# Altium footprint library Connectors THD.PcbLib: 631 footprints (part 44 of 46) (continued)
## TYCO_6469028-1 [mm] "40 Positions, Pitch 2.5mm,  Advanced TCA, Z-PACK HM-Zd Right Angle Press Fit Receptacle"
height 8.58
pads (60):
  round 1.1 hole 0.6: A1(3,11.7) A2(3,9.2) A3(3,6.7) A4(3,4.2) A5(3,1.7) A6(3,-0.8) A7(3,-3.3) A8(3,-5.8) A9(3,-8.3) A10(3,-10.8) B1(1.5,11.7) B2(1.5,9.2) B3(1.5,6.7) B4(1.5,4.2) B5(1.5,1.7) B6(1.5,-0.8) B7(1.5,-3.3) B8(1.5,-5.8) B9(1.5,-8.3) B10(1.5,-10.8) BG1(0,11.7) BG2(0,9.2) BG3(0,6.7) BG4(0,4.2) BG5(0,1.7) BG6(0,-0.8) BG7(0,-3.3) BG8(0,-5.8) BG9(0,-8.3) BG10(0,-10.8) C1(-1.5,11.7) C2(-1.5,9.2) C3(-1.5,6.7) C4(-1.5,4.2) C5(-1.5,1.7) C6(-1.5,-0.8) C7(-1.5,-3.3) C8(-1.5,-5.8) C9(-1.5,-8.3) C10(-1.5,-10.8) D1(-3,11.7) D2(-3,9.2) D3(-3,6.7) D4(-3,4.2) D5(-3,1.7) D6(-3,-0.8) D7(-3,-3.3) D8(-3,-5.8) D9(-3,-8.3) D10(-3,-10.8) DG1(-4.5,11.7) DG2(-4.5,9.2) DG3(-4.5,6.7) DG4(-4.5,4.2) DG5(-4.5,1.7) DG6(-4.5,-0.8) DG7(-4.5,-3.3) DG8(-4.5,-5.8) DG9(-4.5,-8.3) DG10(-4.5,-10.8)
Top Overlay:
  lines w0.2: -5.2,-11.583 -5.2,-12.45 13.7,-12.45 13.7,12.45 -5.2,12.45 ; 3.54,-12.45 3.54,-11.701 ; 3.54,-11.88 7.9,-11.88 7.9,-10.62 4.034,-10.62 ; 3.54,-9.38 7.9,-9.38 7.9,-8.12 4.034,-8.12 ; 3.54,-6.88 7.9,-6.88 7.9,-5.62 4.034,-5.62 ; 3.54,-4.38 7.9,-4.38 7.9,-3.12 4.034,-3.12 ; 3.54,-1.88 7.9,-1.88 7.9,-0.62 4.034,-0.62 ; 3.54,0.62 7.9,0.62 7.9,1.88 4.034,1.88 ; 3.54,3.12 7.9,3.12 7.9,4.38 4.034,4.38 ; 3.54,5.62 7.9,5.62 7.9,6.88 3.54,6.88 ; 3.54,8.12 7.9,8.12 7.9,9.38 3.54,9.38 ; 3.54,10.62 7.9,10.62 7.9,11.88 4.034,11.88 ; 4.45,-12.45 4.45,-11.88 ; 4.45,-10.62 4.45,-9.38 ; 4.45,-8.12 4.45,-6.88 ; 4.45,-5.62 4.45,-4.38 ; 4.45,-3.12 4.45,-1.88 ; 4.45,-0.62 4.45,0.62 ; 4.45,1.88 4.45,3.12 ; 4.45,4.38 4.45,5.62 ; 4.45,6.88 4.45,8.12 ; 4.45,9.38 4.45,10.62 ; 4.45,11.88 4.45,12.45 ; 11.13,-6.963 11.13,-3.037 ; 11.13,3.037 11.13,6.963 ; 13.35,-12.45 13.35,-7 ; 13.35,-3 13.35,3 ; 13.35,7 13.35,12.45 ; 13.7,-9.5 14.7,-8.5 14.7,-6.5 14.45,-6.25 ; 13.7,9.5 14.7,8.5 14.7,6.5 14.45,6.25 ; 9.4,-6.903 9.4,-3.097 13.7,-3 14.7,-4 14.7,-6 13.7,-7 12.2,-7 9.4,-6.903 ; 9.4,3.097 9.4,6.903 13.7,7 14.7,6 14.7,4 13.7,3 12.2,3 9.4,3.097
Mechanical 8:
  drawing of 246 lines, arcs and shapes, not listed
  text "PCB Edge" at 5.865,-3.5 h1
Mechanical 14:
  lines w0.1: 3.54,-12.45 3.54,12.45 ; 3.54,-11.88 7.9,-11.88 7.9,-10.62 3.54,-10.62 ; 3.54,-9.38 7.9,-9.38 7.9,-8.12 3.54,-8.12 ; 3.54,-6.88 7.9,-6.88 7.9,-5.62 3.54,-5.62 ; 3.54,-4.38 7.9,-4.38 7.9,-3.12 3.54,-3.12 ; 3.54,-1.88 7.9,-1.88 7.9,-0.62 3.54,-0.62 ; 3.54,0.62 7.9,0.62 7.9,1.88 3.54,1.88 ; 3.54,3.12 7.9,3.12 7.9,4.38 3.54,4.38 ; 3.54,5.62 7.9,5.62 7.9,6.88 3.54,6.88 ; 3.54,8.12 7.9,8.12 7.9,9.38 3.54,9.38 ; 3.54,10.62 7.9,10.62 7.9,11.88 3.54,11.88 ; 4.45,-12.45 4.45,-11.88 ; 4.45,-10.62 4.45,-9.38 ; 4.45,-8.12 4.45,-6.88 ; 4.45,-5.62 4.45,-4.38 ; 4.45,-3.12 4.45,-1.88 ; 4.45,-0.62 4.45,0.62 ; 4.45,1.88 4.45,3.12 ; 4.45,4.38 4.45,5.62 ; 4.45,6.88 4.45,8.12 ; 4.45,9.38 4.45,10.62 ; 4.45,11.88 4.45,12.45 ; 5,-12.45 5,-11.5 ; 5,-10.5 5,-9.5 ; 5,-8.5 5,-7.5 ; 5,-6.5 5,-5.5 ; 5,-4.5 5,-3.5 ; 5,-2.5 5,-1.5 ; 5,-0.5 5,0.5 ; 5,1.5 5,2.5 ; 5,3.5 5,4.5 ; 5,5.5 5,6.5 ; 5,7.5 5,8.5 ; 5,9.5 5,10.5 ; 5,11.5 5,12.45 ; 11.13,-6.963 11.13,-3.037 ; 11.13,3.037 11.13,6.963 ; 13.35,-12.45 13.35,-7 ; 13.35,-3 13.35,3 ; 13.35,7 13.35,12.45 ; 13.7,-9.5 14.7,-8.5 14.7,-6.5 14.45,-6.25 ; 13.7,9.5 14.7,8.5 14.7,6.5 14.45,6.25 ; -5.2,-12.45 13.7,-12.45 13.7,12.45 -5.2,12.45 -5.2,-12.45 ; 9.4,-6.903 9.4,-3.097 13.7,-3 14.7,-4 14.7,-6 13.7,-7 12.2,-7 9.4,-6.903 ; 9.4,3.097 9.4,6.903 13.7,7 14.7,6 14.7,4 13.7,3 12.2,3 9.4,3.097
Drill Drawing:
  lines w0.1: -5.2,-12.45 -5.2,12.45 3.775,12.45 3.775,-12.45 -5.2,-12.45
  text "PRESS-FIT TECHNOLOGY" at 5.265,-8.3 h1
  text "diam. 0.6mm +0.06 -0" at 6.765,-9.3 h1
3D body: height 8.67, standoff -4.68, extent -5.2,-12.45 14.7,12.45

## VERO_20-2136 [mm] "Black Bead PCB Terminal Test Pin (1.32 mm hole)"
height 5.4
pads (1):
  round 2 hole 1.3: 1(0,0)
Top Overlay:
  circle w0.2: c0,0 r1.5
Mechanical 14:
  circle w0.1: c0,0 r1.5
3D body: height 5.4, standoff -3.17, extent -1.5,-1.5 1.5,1.5

## WAGO_236-402 [mm] "16A 250VAC 2 Way PCB Terminal Block, Pitch 5mm, CAGE CLAMP® Connection, Wire Size Max: 2.5mm²"
height 13
pads (4):
  round 1.8 hole 1.1: 1(-2.5,-2.5) 1(-2.5,2.5) 2(2.5,-2.5) 2(2.5,2.5)
Top Overlay:
  lines w0.2: -5.4,-5.34 -6,-5.34 -6,-4.14 -5.4,-4.14 ; -5.4,-1.51 -6,-1.51 -6,0.09 -5.4,0.09 ; -5.4,0.77 5.6,0.77 ; -5.4,1.256 5.6,1.256 0.6,1.256 1.1,1.256 ; -5.4,2.76 -3.723,2.76 ; -5.4,3.582 -6,3.582 -6,5.182 -5.4,5.182 ; -5.4,5.905 -6,5.905 -6,7.101 -5.4,7.101 ; -4.4,-2.937 -3.962,-2.937 ; -3.7,-0.745 -0.1,-0.745 ; -3.7,0.21 -0.1,0.21 ; -3.671,-2.937 -3.962,-2.937 ; -3.5,-3.25 -3.5,-4.245 ; -2.715,3.957 -2.715,6.149 ccw(c-3.215,6.192) -3.008,6.649 ccw(c-3.952,4.735) -3.715,6.857 ; -2.715,5.796 -1.485,5.796 ; -1.485,3.957 -1.485,6.149 cw(c-0.985,6.192) -1.192,6.649 cw(c-0.247,4.735) -0.485,6.857 ; -1.329,-2.937 1.329,-2.937 ; -1.277,2.76 1.277,2.76 ; -1.05,-2.937 -1.05,-4.245 ; 0.106,-2.937 0.2,-3.043 ; 1.038,-2.937 1,-3.043 ; 1.3,-0.745 4.9,-0.745 ; 1.3,0.21 4.9,0.21 ; 1.5,-3.25 1.5,-4.245 ; 2.285,3.957 2.285,6.149 ccw(c1.785,6.192) 1.992,6.649 ccw(c1.048,4.735) 1.285,6.857 ; 2.285,5.796 3.515,5.796 ; 3.515,3.957 3.515,6.149 cw(c4.015,6.192) 3.808,6.649 cw(c4.753,4.735) 4.515,6.857 ; 3.671,-2.937 5.6,-2.937 ; 3.723,2.76 5.6,2.76 ; 3.95,-2.937 3.95,-4.245 ; 5.106,-2.937 5.2,-3.043 ; 5.6,-6.585 -5.4,-6.585 -5.4,7.5 5.6,7.5 5.6,-6.572 ; 5.6,-3.043 5.2,-3.043 ; 5.6,-1.968 6.3,-1.968 6.3,1.412 5.6,1.412 ; 5.6,-0.851 4.9,-0.851 4.9,0.705 1.3,0.705 1.3,-0.851 -0.1,-0.851 -0.1,0.705 -3.7,0.705 -3.7,-0.851 -4.4,-0.851 -4.4,-3.043 -4,-3.043 ; -4,-6.231 -3.5,-4.245 ; -4,-6.231 0.2,-6.231 ; -4,-6.231 -4,-3.043 ; -4,-3.043 -3.962,-2.937 ; -3.715,6.857 -3.715,3.957 -0.485,3.957 -0.485,6.857 ; -3.715,6.857 -0.485,6.857 ; -3.5,-4.245 -1.05,-4.245 ; -1.05,-4.245 0.2,-6.231 ; 0.2,-6.231 0.2,-3.043 ; 0.2,-3.043 1,-3.043 ; 1,-6.231 1.5,-4.245 ; 1,-6.231 5.2,-6.231 ; 1,-6.231 1,-3.043 ; 1.285,6.857 1.285,3.957 4.515,3.957 4.515,6.857 ; 1.285,6.857 4.515,6.857 ; 1.5,-4.245 3.95,-4.245 ; 3.95,-4.245 5.2,-6.231 ; 5.2,-6.231 5.2,-3.043
Mechanical 8:
  lines w0.1: -3.5,-2.5 -2.5,-2.5 ; -3.5,2.5 -2.5,2.5 ; -2.5,-3.5 -2.5,-2.5 ; -2.5,-1.5 -2.5,-2.5 ; -2.5,1.5 -2.5,2.5 ; -2.5,3.5 -2.5,2.5 ; -1.5,-2.5 -2.5,-2.5 ; -1.5,2.5 -2.5,2.5 ; -0.5,0 0,0 ; 0,-0.5 0,0 ; 0,0.5 0,0 ; 0.5,0 0,0 ; 1.5,-2.5 2.5,-2.5 ; 1.5,2.5 2.5,2.5 ; 2.5,-3.5 2.5,-2.5 ; 2.5,-1.5 2.5,-2.5 ; 2.5,1.5 2.5,2.5 ; 2.5,3.5 2.5,2.5 ; 3.5,-2.5 2.5,-2.5 ; 3.5,2.5 2.5,2.5
Mechanical 14:
  lines w0.1: -5.4,-5.34 -6,-5.34 -6,-4.14 -5.4,-4.14 ; -5.4,-1.51 -6,-1.51 -6,0.09 -5.4,0.09 ; -5.4,0.77 5.6,0.77 ; -5.4,1.256 5.6,1.256 0.6,1.256 ; -5.4,2.76 5.6,2.76 ; -5.4,3.582 -6,3.582 -6,5.182 -5.4,5.182 ; -5.4,5.905 -6,5.905 -6,7.101 -5.4,7.101 ; -4.4,-2.937 5.6,-2.937 ; -3.962,-2.937 -4,-3.043 ; -3.7,-0.745 -0.1,-0.745 ; -3.7,0.21 -0.1,0.21 ; -3.5,-2.937 -3.5,-4.245 ; -2.715,3.957 -2.715,6.149 ccw(c-3.215,6.192) -3.008,6.649 ccw(c-3.952,4.735) -3.715,6.857 ; -2.715,5.796 -1.485,5.796 ; -1.485,3.957 -1.485,6.149 cw(c-0.985,6.192) -1.192,6.649 cw(c-0.247,4.735) -0.485,6.857 ; -1.05,-2.937 -1.05,-4.245 ; 0.106,-2.937 0.2,-3.043 ; 1.038,-2.937 1,-3.043 ; 1.3,-0.745 4.9,-0.745 ; 1.3,0.21 4.9,0.21 ; 1.5,-2.937 1.5,-4.245 ; 2.285,3.957 2.285,6.149 ccw(c1.785,6.192) 1.992,6.649 ccw(c1.048,4.735) 1.285,6.857 ; 2.285,5.796 3.515,5.796 ; 3.515,3.957 3.515,6.149 cw(c4.015,6.192) 3.808,6.649 cw(c4.753,4.735) 4.515,6.857 ; 3.95,-2.937 3.95,-4.245 ; 5.106,-2.937 5.2,-3.043 ; 5.6,-6.585 -5.4,-6.585 -5.4,7.5 5.6,7.5 5.6,-6.572 ; 5.6,-3.043 5.2,-3.043 ; 5.6,-1.968 6.3,-1.968 6.3,1.412 5.6,1.412 ; 5.6,-0.851 4.9,-0.851 4.9,0.705 1.3,0.705 1.3,-0.851 -0.1,-0.851 -0.1,0.705 -3.7,0.705 -3.7,-0.851 -4.4,-0.851 -4.4,-3.043 -4,-3.043 ; -4,-6.231 -3.5,-4.245 ; -4,-6.231 0.2,-6.231 ; -4,-6.231 -4,-3.043 ; -3.715,6.857 -3.715,3.957 -0.485,3.957 -0.485,6.857 ; -3.715,6.857 -0.485,6.857 ; -3.5,-4.245 -1.05,-4.245 ; -1.05,-4.245 0.2,-6.231 ; 0.2,-6.231 0.2,-3.043 ; 0.2,-3.043 1,-3.043 ; 1,-6.231 1.5,-4.245 ; 1,-6.231 5.2,-6.231 ; 1,-6.231 1,-3.043 ; 1.285,6.857 1.285,3.957 4.515,3.957 4.515,6.857 ; 1.285,6.857 4.515,6.857 ; 1.5,-4.245 3.95,-4.245 ; 3.95,-4.245 5.2,-6.231 ; 5.2,-6.231 5.2,-3.043
3D body: height 12.71, standoff -4, extent -6,-6.585 6.3,7.5

## WAGO_236-403 [mm] "16A 250VAC 3 Way PCB Terminal Block, Pitch 5mm, CAGE CLAMP® Connection, Wire Size Max: 2.5mm²"
height 13
pads (6):
  round 1.8 hole 1.1: 1(-5,-2.5) 1(-5,2.5) 2(0,-2.5) 2(0,2.5) 3(5,-2.5) 3(5,2.5)
Top Overlay:
  lines w0.2: -7.9,-5.34 -8.5,-5.34 -8.5,-4.14 -7.9,-4.14 ; -7.9,-1.51 -8.5,-1.51 -8.5,0.09 -7.9,0.09 ; -7.9,0.77 8.1,0.77 ; -7.9,1.256 8.1,1.256 -1.9,1.256 -1.4,1.256 ; -7.9,2.76 -6.223,2.76 ; -7.9,3.582 -8.5,3.582 -8.5,5.182 -7.9,5.182 ; -7.9,5.905 -8.5,5.905 -8.5,7.101 -7.9,7.101 ; -6.9,-2.937 -6.463,-2.937 ; -6.2,-0.745 -2.6,-0.745 ; -6.2,0.21 -2.6,0.21 ; -6.171,-2.937 -6.463,-2.937 ; -6,-3.25 -6,-4.245 ; -5.215,3.957 -5.215,6.149 ccw(c-5.715,6.192) -5.508,6.649 ccw(c-6.452,4.735) -6.215,6.857 ; -5.215,5.796 -3.985,5.796 ; -3.985,3.957 -3.985,6.149 cw(c-3.485,6.192) -3.692,6.649 cw(c-2.748,4.735) -2.985,6.857 ; -3.829,-2.937 -1.171,-2.937 ; -3.777,2.76 -1.223,2.76 ; -3.55,-2.937 -3.55,-4.245 ; -2.394,-2.937 -2.3,-3.043 ; -1.463,-2.937 -1.5,-3.043 ; -1.2,-0.745 2.4,-0.745 ; -1.2,0.21 2.4,0.21 ; -1,-3.25 -1,-4.245 ; -0.215,3.957 -0.215,6.149 ccw(c-0.715,6.192) -0.508,6.649 ccw(c-1.452,4.735) -1.215,6.857 ; -0.215,5.796 1.015,5.796 ; 1.015,3.957 1.015,6.149 cw(c1.515,6.192) 1.308,6.649 cw(c2.252,4.735) 2.015,6.857 ; 1.171,-2.937 3.829,-2.937 ; 1.223,2.76 3.777,2.76 ; 1.45,-2.937 1.45,-4.245 ; 2.606,-2.937 2.7,-3.043 ; 3.538,-2.937 3.5,-3.043 ; 3.8,-0.745 7.4,-0.745 ; 3.8,0.21 7.4,0.21 ; 4,-3.25 4,-4.245 ; 4.785,3.957 4.785,6.149 ccw(c4.285,6.192) 4.492,6.649 ccw(c3.548,4.735) 3.785,6.857 ; 4.785,5.796 6.015,5.796 ; 6.015,3.957 6.015,6.149 cw(c6.515,6.192) 6.308,6.649 cw(c7.252,4.735) 7.015,6.857 ; 6.171,-2.937 8.1,-2.937 ; 6.223,2.76 8.1,2.76 ; 6.45,-2.937 6.45,-4.245 ; 7.606,-2.937 7.7,-3.043 ; 8.1,-6.585 -7.9,-6.585 -7.9,7.5 8.1,7.5 8.1,-6.572 ; 8.1,-3.043 7.7,-3.043 ; 8.1,-1.968 8.8,-1.968 8.8,1.412 8.1,1.412 ; 8.1,-0.851 7.4,-0.851 7.4,0.705 3.8,0.705 3.8,-0.851 2.4,-0.851 2.4,0.705 -1.2,0.705 -1.2,-0.851 -2.6,-0.851 -2.6,0.705 -6.2,0.705 -6.2,-0.851 -6.9,-0.851 -6.9,-3.043 -6.5,-3.043 ; -6.5,-6.231 -6,-4.245 ; -6.5,-6.231 -2.3,-6.231 ; -6.5,-6.231 -6.5,-3.043 ; -6.5,-3.043 -6.463,-2.937 ; -6.215,6.857 -6.215,3.957 -2.985,3.957 -2.985,6.857 ; -6.215,6.857 -2.985,6.857 ; -6,-4.245 -3.55,-4.245 ; -3.55,-4.245 -2.3,-6.231 ; -2.3,-6.231 -2.3,-3.043 ; -2.3,-3.043 -1.5,-3.043 ; -1.5,-6.231 -1,-4.245 ; -1.5,-6.231 2.7,-6.231 ; -1.5,-6.231 -1.5,-3.043 ; -1.215,6.857 -1.215,3.957 2.015,3.957 2.015,6.857 ; -1.215,6.857 2.015,6.857 ; -1,-4.245 1.45,-4.245 ; 1.45,-4.245 2.7,-6.231 ; 2.7,-6.231 2.7,-3.043 ; 2.7,-3.043 3.5,-3.043 ; 3.5,-6.231 4,-4.245 ; 3.5,-6.231 7.7,-6.231 ; 3.5,-6.231 3.5,-3.043 ; 3.785,6.857 3.785,3.957 7.015,3.957 7.015,6.857 ; 3.785,6.857 7.015,6.857 ; 4,-4.245 6.45,-4.245 ; 6.45,-4.245 7.7,-6.231 ; 7.7,-6.231 7.7,-3.043
Mechanical 8:
  lines w0.1: -6,-2.5 -5,-2.5 ; -6,2.5 -5,2.5 ; -5,-3.5 -5,-2.5 ; -5,-1.5 -5,-2.5 ; -5,1.5 -5,2.5 ; -5,3.5 -5,2.5 ; -4,-2.5 -5,-2.5 ; -4,2.5 -5,2.5 ; -1,-2.5 0,-2.5 ; -1,0 0,0 ; -1,2.5 0,2.5 ; 0,-3.5 0,-2.5 ; 0,-1.5 0,-2.5 ; 0,-1 0,0 ; 0,1 0,0 ; 0,1.5 0,2.5 ; 0,3.5 0,2.5 ; 1,-2.5 0,-2.5 ; 1,0 0,0 ; 1,2.5 0,2.5 ; 4,-2.5 5,-2.5 ; 4,2.5 5,2.5 ; 5,-3.5 5,-2.5 ; 5,-1.5 5,-2.5 ; 5,1.5 5,2.5 ; 5,3.5 5,2.5 ; 6,-2.5 5,-2.5 ; 6,2.5 5,2.5
Mechanical 14:
  lines w0.1: -7.9,-5.34 -8.5,-5.34 -8.5,-4.14 -7.9,-4.14 ; -7.9,-1.51 -8.5,-1.51 -8.5,0.09 -7.9,0.09 ; -7.9,0.77 8.1,0.77 ; -7.9,1.256 8.1,1.256 -1.9,1.256 ; -7.9,2.76 8.1,2.76 ; -7.9,3.582 -8.5,3.582 -8.5,5.182 -7.9,5.182 ; -7.9,5.905 -8.5,5.905 -8.5,7.101 -7.9,7.101 ; -6.9,-2.937 8.1,-2.937 ; -6.463,-2.937 -6.5,-3.043 ; -6.2,-0.745 -2.6,-0.745 ; -6.2,0.21 -2.6,0.21 ; -6,-2.937 -6,-4.245 ; -5.215,3.957 -5.215,6.149 ccw(c-5.715,6.192) -5.508,6.649 ccw(c-6.452,4.735) -6.215,6.857 ; -5.215,5.796 -3.985,5.796 ; -3.985,3.957 -3.985,6.149 cw(c-3.485,6.192) -3.692,6.649 cw(c-2.748,4.735) -2.985,6.857 ; -3.55,-2.937 -3.55,-4.245 ; -2.394,-2.937 -2.3,-3.043 ; -1.463,-2.937 -1.5,-3.043 ; -1.2,-0.745 2.4,-0.745 ; -1.2,0.21 2.4,0.21 ; -1,-2.937 -1,-4.245 ; -0.215,3.957 -0.215,6.149 ccw(c-0.715,6.192) -0.508,6.649 ccw(c-1.452,4.735) -1.215,6.857 ; -0.215,5.796 1.015,5.796 ; 1.015,3.957 1.015,6.149 cw(c1.515,6.192) 1.308,6.649 cw(c2.252,4.735) 2.015,6.857 ; 1.45,-2.937 1.45,-4.245 ; 2.606,-2.937 2.7,-3.043 ; 3.538,-2.937 3.5,-3.043 ; 3.8,-0.745 7.4,-0.745 ; 3.8,0.21 7.4,0.21 ; 4,-2.937 4,-4.245 ; 4.785,3.957 4.785,6.149 ccw(c4.285,6.192) 4.492,6.649 ccw(c3.548,4.735) 3.785,6.857 ; 4.785,5.796 6.015,5.796 ; 6.015,3.957 6.015,6.149 cw(c6.515,6.192) 6.308,6.649 cw(c7.252,4.735) 7.015,6.857 ; 6.45,-2.937 6.45,-4.245 ; 7.606,-2.937 7.7,-3.043 ; 8.1,-6.585 -7.9,-6.585 -7.9,7.5 8.1,7.5 8.1,-6.572 ; 8.1,-3.043 7.7,-3.043 ; 8.1,-1.968 8.8,-1.968 8.8,1.412 8.1,1.412 ; 8.1,-0.851 7.4,-0.851 7.4,0.705 3.8,0.705 3.8,-0.851 2.4,-0.851 2.4,0.705 -1.2,0.705 -1.2,-0.851 -2.6,-0.851 -2.6,0.705 -6.2,0.705 -6.2,-0.851 -6.9,-0.851 -6.9,-3.043 -6.5,-3.043 ; -6.5,-6.231 -6,-4.245 ; -6.5,-6.231 -2.3,-6.231 ; -6.5,-6.231 -6.5,-3.043 ; -6.215,6.857 -6.215,3.957 -2.985,3.957 -2.985,6.857 ; -6.215,6.857 -2.985,6.857 ; -6,-4.245 -3.55,-4.245 ; -3.55,-4.245 -2.3,-6.231 ; -2.3,-6.231 -2.3,-3.043 ; -2.3,-3.043 -1.5,-3.043 ; -1.5,-6.231 -1,-4.245 ; -1.5,-6.231 2.7,-6.231 ; -1.5,-6.231 -1.5,-3.043 ; -1.215,6.857 -1.215,3.957 2.015,3.957 2.015,6.857 ; -1.215,6.857 2.015,6.857 ; -1,-4.245 1.45,-4.245 ; 1.45,-4.245 2.7,-6.231 ; 2.7,-6.231 2.7,-3.043 ; 2.7,-3.043 3.5,-3.043 ; 3.5,-6.231 4,-4.245 ; 3.5,-6.231 7.7,-6.231 ; 3.5,-6.231 3.5,-3.043 ; 3.785,6.857 3.785,3.957 7.015,3.957 7.015,6.857 ; 3.785,6.857 7.015,6.857 ; 4,-4.245 6.45,-4.245 ; 6.45,-4.245 7.7,-6.231 ; 7.7,-6.231 7.7,-3.043
3D body: height 12.71, standoff -4, extent -8.5,-6.585 8.8,7.5

## WAGO_236-403/000-009 [mm] "16A 250VAC 3 Way PCB Terminal Block, Pitch 5mm, CAGE CLAMP® Connection, Wire Size Max: 2.5mm²"
height 13
pads (6):
  round 1.8 hole 1.1: 1(-5,-2.5) 1(-5,2.5) 2(0,-2.5) 2(0,2.5) 3(5,-2.5) 3(5,2.5)
Top Overlay:
  lines w0.2: -7.9,-5.34 -8.5,-5.34 -8.5,-4.14 -7.9,-4.14 ; -7.9,-1.51 -8.5,-1.51 -8.5,0.09 -7.9,0.09 ; -7.9,0.77 8.1,0.77 ; -7.9,1.256 8.1,1.256 -1.9,1.256 -1.4,1.256 ; -7.9,2.76 -6.223,2.76 ; -7.9,3.582 -8.5,3.582 -8.5,5.182 -7.9,5.182 ; -7.9,5.905 -8.5,5.905 -8.5,7.101 -7.9,7.101 ; -6.9,-2.937 -6.463,-2.937 ; -6.2,-0.745 -2.6,-0.745 ; -6.2,0.21 -2.6,0.21 ; -6.171,-2.937 -6.463,-2.937 ; -6,-3.25 -6,-4.245 ; -5.215,3.957 -5.215,6.149 ccw(c-5.715,6.192) -5.508,6.649 ccw(c-6.452,4.735) -6.215,6.857 ; -5.215,5.796 -3.985,5.796 ; -3.985,3.957 -3.985,6.149 cw(c-3.485,6.192) -3.692,6.649 cw(c-2.748,4.735) -2.985,6.857 ; -3.829,-2.937 -1.171,-2.937 ; -3.777,2.76 -1.223,2.76 ; -3.55,-2.937 -3.55,-4.245 ; -2.394,-2.937 -2.3,-3.043 ; -1.463,-2.937 -1.5,-3.043 ; -1.2,-0.745 2.4,-0.745 ; -1.2,0.21 2.4,0.21 ; -1,-3.25 -1,-4.245 ; -0.215,3.957 -0.215,6.149 ccw(c-0.715,6.192) -0.508,6.649 ccw(c-1.452,4.735) -1.215,6.857 ; -0.215,5.796 1.015,5.796 ; 1.015,3.957 1.015,6.149 cw(c1.515,6.192) 1.308,6.649 cw(c2.252,4.735) 2.015,6.857 ; 1.171,-2.937 3.829,-2.937 ; 1.223,2.76 3.777,2.76 ; 1.45,-2.937 1.45,-4.245 ; 2.606,-2.937 2.7,-3.043 ; 3.538,-2.937 3.5,-3.043 ; 3.8,-0.745 7.4,-0.745 ; 3.8,0.21 7.4,0.21 ; 4,-3.25 4,-4.245 ; 4.785,3.957 4.785,6.149 ccw(c4.285,6.192) 4.492,6.649 ccw(c3.548,4.735) 3.785,6.857 ; 4.785,5.796 6.015,5.796 ; 6.015,3.957 6.015,6.149 cw(c6.515,6.192) 6.308,6.649 cw(c7.252,4.735) 7.015,6.857 ; 6.171,-2.937 8.1,-2.937 ; 6.223,2.76 8.1,2.76 ; 6.45,-2.937 6.45,-4.245 ; 7.606,-2.937 7.7,-3.043 ; 8.1,-6.585 -7.9,-6.585 -7.9,7.5 8.1,7.5 8.1,-6.572 ; 8.1,-3.043 7.7,-3.043 ; 8.1,-1.968 8.8,-1.968 8.8,1.412 8.1,1.412 ; 8.1,-0.851 7.4,-0.851 7.4,0.705 3.8,0.705 3.8,-0.851 2.4,-0.851 2.4,0.705 -1.2,0.705 -1.2,-0.851 -2.6,-0.851 -2.6,0.705 -6.2,0.705 -6.2,-0.851 -6.9,-0.851 -6.9,-3.043 -6.5,-3.043 ; -6.5,-6.231 -6,-4.245 ; -6.5,-6.231 -2.3,-6.231 ; -6.5,-6.231 -6.5,-3.043 ; -6.5,-3.043 -6.463,-2.937 ; -6.215,6.857 -6.215,3.957 -2.985,3.957 -2.985,6.857 ; -6.215,6.857 -2.985,6.857 ; -6,-4.245 -3.55,-4.245 ; -3.55,-4.245 -2.3,-6.231 ; -2.3,-6.231 -2.3,-3.043 ; -2.3,-3.043 -1.5,-3.043 ; -1.5,-6.231 -1,-4.245 ; -1.5,-6.231 2.7,-6.231 ; -1.5,-6.231 -1.5,-3.043 ; -1.215,6.857 -1.215,3.957 2.015,3.957 2.015,6.857 ; -1.215,6.857 2.015,6.857 ; -1,-4.245 1.45,-4.245 ; 1.45,-4.245 2.7,-6.231 ; 2.7,-6.231 2.7,-3.043 ; 2.7,-3.043 3.5,-3.043 ; 3.5,-6.231 4,-4.245 ; 3.5,-6.231 7.7,-6.231 ; 3.5,-6.231 3.5,-3.043 ; 3.785,6.857 3.785,3.957 7.015,3.957 7.015,6.857 ; 3.785,6.857 7.015,6.857 ; 4,-4.245 6.45,-4.245 ; 6.45,-4.245 7.7,-6.231 ; 7.7,-6.231 7.7,-3.043
Mechanical 8:
  lines w0.1: -6,-2.5 -5,-2.5 ; -6,2.5 -5,2.5 ; -5,-3.5 -5,-2.5 ; -5,-1.5 -5,-2.5 ; -5,1.5 -5,2.5 ; -5,3.5 -5,2.5 ; -4,-2.5 -5,-2.5 ; -4,2.5 -5,2.5 ; -1,-2.5 0,-2.5 ; -1,0 0,0 ; -1,2.5 0,2.5 ; 0,-3.5 0,-2.5 ; 0,-1.5 0,-2.5 ; 0,-1 0,0 ; 0,1 0,0 ; 0,1.5 0,2.5 ; 0,3.5 0,2.5 ; 1,-2.5 0,-2.5 ; 1,0 0,0 ; 1,2.5 0,2.5 ; 4,-2.5 5,-2.5 ; 4,2.5 5,2.5 ; 5,-3.5 5,-2.5 ; 5,-1.5 5,-2.5 ; 5,1.5 5,2.5 ; 5,3.5 5,2.5 ; 6,-2.5 5,-2.5 ; 6,2.5 5,2.5
Mechanical 14:
  lines w0.1: -7.9,-5.34 -8.5,-5.34 -8.5,-4.14 -7.9,-4.14 ; -7.9,-1.51 -8.5,-1.51 -8.5,0.09 -7.9,0.09 ; -7.9,0.77 8.1,0.77 ; -7.9,1.256 8.1,1.256 -1.9,1.256 ; -7.9,2.76 8.1,2.76 ; -7.9,3.582 -8.5,3.582 -8.5,5.182 -7.9,5.182 ; -7.9,5.905 -8.5,5.905 -8.5,7.101 -7.9,7.101 ; -6.9,-2.937 8.1,-2.937 ; -6.463,-2.937 -6.5,-3.043 ; -6.2,-0.745 -2.6,-0.745 ; -6.2,0.21 -2.6,0.21 ; -6,-2.937 -6,-4.245 ; -5.215,3.957 -5.215,6.149 ccw(c-5.715,6.192) -5.508,6.649 ccw(c-6.452,4.735) -6.215,6.857 ; -5.215,5.796 -3.985,5.796 ; -3.985,3.957 -3.985,6.149 cw(c-3.485,6.192) -3.692,6.649 cw(c-2.748,4.735) -2.985,6.857 ; -3.55,-2.937 -3.55,-4.245 ; -2.394,-2.937 -2.3,-3.043 ; -1.463,-2.937 -1.5,-3.043 ; -1.2,-0.745 2.4,-0.745 ; -1.2,0.21 2.4,0.21 ; -1,-2.937 -1,-4.245 ; -0.215,3.957 -0.215,6.149 ccw(c-0.715,6.192) -0.508,6.649 ccw(c-1.452,4.735) -1.215,6.857 ; -0.215,5.796 1.015,5.796 ; 1.015,3.957 1.015,6.149 cw(c1.515,6.192) 1.308,6.649 cw(c2.252,4.735) 2.015,6.857 ; 1.45,-2.937 1.45,-4.245 ; 2.606,-2.937 2.7,-3.043 ; 3.538,-2.937 3.5,-3.043 ; 3.8,-0.745 7.4,-0.745 ; 3.8,0.21 7.4,0.21 ; 4,-2.937 4,-4.245 ; 4.785,3.957 4.785,6.149 ccw(c4.285,6.192) 4.492,6.649 ccw(c3.548,4.735) 3.785,6.857 ; 4.785,5.796 6.015,5.796 ; 6.015,3.957 6.015,6.149 cw(c6.515,6.192) 6.308,6.649 cw(c7.252,4.735) 7.015,6.857 ; 6.45,-2.937 6.45,-4.245 ; 7.606,-2.937 7.7,-3.043 ; 8.1,-6.585 -7.9,-6.585 -7.9,7.5 8.1,7.5 8.1,-6.572 ; 8.1,-3.043 7.7,-3.043 ; 8.1,-1.968 8.8,-1.968 8.8,1.412 8.1,1.412 ; 8.1,-0.851 7.4,-0.851 7.4,0.705 3.8,0.705 3.8,-0.851 2.4,-0.851 2.4,0.705 -1.2,0.705 -1.2,-0.851 -2.6,-0.851 -2.6,0.705 -6.2,0.705 -6.2,-0.851 -6.9,-0.851 -6.9,-3.043 -6.5,-3.043 ; -6.5,-6.231 -6,-4.245 ; -6.5,-6.231 -2.3,-6.231 ; -6.5,-6.231 -6.5,-3.043 ; -6.215,6.857 -6.215,3.957 -2.985,3.957 -2.985,6.857 ; -6.215,6.857 -2.985,6.857 ; -6,-4.245 -3.55,-4.245 ; -3.55,-4.245 -2.3,-6.231 ; -2.3,-6.231 -2.3,-3.043 ; -2.3,-3.043 -1.5,-3.043 ; -1.5,-6.231 -1,-4.245 ; -1.5,-6.231 2.7,-6.231 ; -1.5,-6.231 -1.5,-3.043 ; -1.215,6.857 -1.215,3.957 2.015,3.957 2.015,6.857 ; -1.215,6.857 2.015,6.857 ; -1,-4.245 1.45,-4.245 ; 1.45,-4.245 2.7,-6.231 ; 2.7,-6.231 2.7,-3.043 ; 2.7,-3.043 3.5,-3.043 ; 3.5,-6.231 4,-4.245 ; 3.5,-6.231 7.7,-6.231 ; 3.5,-6.231 3.5,-3.043 ; 3.785,6.857 3.785,3.957 7.015,3.957 7.015,6.857 ; 3.785,6.857 7.015,6.857 ; 4,-4.245 6.45,-4.245 ; 6.45,-4.245 7.7,-6.231 ; 7.7,-6.231 7.7,-3.043
3D body: height 12.71, standoff -4, extent -8.5,-6.585 8.8,7.5

## WAGO_236-404 [mm] "16A 250VAC 4 Way PCB Terminal Block, Pitch 5mm, CAGE CLAMP® Connection, Wire Size Max: 2.5mm²"
height 13
pads (8):
  round 1.8 hole 1.1: 1(-7.6,-3.756) 1(-7.6,1.244) 2(-2.6,-3.756) 2(-2.6,1.244) 3(2.4,-3.756) 3(2.4,1.244) 4(7.4,-3.756) 4(7.4,1.244)
Top Overlay:
  lines w0.2: -10.5,-6.596 -11.1,-6.596 -11.1,-5.396 -10.5,-5.396 ; -10.5,-2.766 -11.1,-2.766 -11.1,-1.166 -10.5,-1.166 ; -10.5,-0.486 10.5,-0.486 ; -10.5,1.504 -8.823,1.504 ; -10.5,2.325 -11.1,2.325 -11.1,3.925 -10.5,3.925 ; -10.5,4.649 -11.1,4.649 -11.1,5.844 -10.5,5.844 ; -9.5,-4.193 -9.063,-4.193 ; -8.8,-2.001 -5.2,-2.001 ; -8.8,-1.047 -5.2,-1.047 ; -8.771,-4.193 -9.063,-4.193 ; -8.6,-4.506 -8.6,-5.501 ; -7.815,2.701 -7.815,4.893 ccw(c-8.315,4.936) -8.108,5.393 ccw(c-9.052,3.479) -8.815,5.6 ; -7.815,4.54 -6.585,4.54 ; -6.585,2.701 -6.585,4.893 cw(c-6.085,4.936) -6.292,5.393 cw(c-5.348,3.479) -5.585,5.6 ; -6.429,-4.193 -3.771,-4.193 ; -6.377,1.504 -3.823,1.504 ; -6.15,-4.193 -6.15,-5.501 ; -3.8,-2.001 -0.2,-2.001 ; -3.8,-1.047 -0.2,-1.047 ; -3.6,-4.506 -3.6,-5.501 ; -2.815,2.701 -2.815,4.893 ccw(c-3.315,4.936) -3.108,5.393 ccw(c-4.052,3.479) -3.815,5.6 ; -2.815,4.54 -1.585,4.54 ; -1.585,2.701 -1.585,4.893 cw(c-1.085,4.936) -1.292,5.393 cw(c-0.348,3.479) -0.585,5.6 ; -1.429,-4.193 1.229,-4.193 ; -1.377,1.504 1.177,1.504 ; -1.15,-4.193 -1.15,-5.501 ; -1,0 1,0 ; 0.006,-4.193 0.1,-4.299 ; 0.938,-4.193 0.9,-4.299 ; 1.2,-2.001 4.8,-2.001 ; 1.2,-1.047 4.8,-1.047 ; 1.4,-4.506 1.4,-5.501 ; 2.185,2.701 2.185,4.893 ccw(c1.685,4.936) 1.892,5.393 ccw(c0.948,3.479) 1.185,5.6 ; 2.185,4.54 3.415,4.54 ; 3.415,2.701 3.415,4.893 cw(c3.915,4.936) 3.708,5.393 cw(c4.652,3.479) 4.415,5.6 ; 3.571,-4.193 6.229,-4.193 ; 3.623,1.504 6.177,1.504 ; 3.85,-4.193 3.85,-5.501 ; 5.006,-4.193 5.1,-4.299 ; 5.938,-4.193 5.9,-4.299 ; 6.2,-2.001 9.8,-2.001 ; 6.2,-1.047 9.8,-1.047 ; 6.4,-4.506 6.4,-5.501 ; 7.185,2.701 7.185,4.893 ccw(c6.685,4.936) 6.892,5.393 ccw(c5.948,3.479) 6.185,5.6 ; 7.185,4.54 8.415,4.54 ; 8.415,2.701 8.415,4.893 cw(c8.915,4.936) 8.708,5.393 cw(c9.652,3.479) 9.415,5.6 ; 8.571,-4.193 10.5,-4.193 ; 8.623,1.504 10.5,1.504 ; 8.85,-4.193 8.85,-5.501 ; 10.006,-4.193 10.1,-4.299 ; 10.5,-7.842 -10.5,-7.842 -10.5,6.244 10.5,6.244 10.5,-7.828 ; 10.5,-4.299 10.1,-4.299 ; 10.5,-3.224 11.2,-3.224 11.2,0.156 10.5,0.156 ; 10.5,-2.107 9.8,-2.107 9.8,-0.552 6.2,-0.552 6.2,-2.107 4.8,-2.107 4.8,-0.552 1.2,-0.552 1.2,-2.107 -0.2,-2.107 -0.2,-0.552 -3.8,-0.552 -3.8,-2.107 -5.2,-2.107 -5.2,-0.552 -8.8,-0.552 -8.8,-2.107 -9.5,-2.107 -9.5,-4.299 -9.1,-4.299 ; -9.1,-7.487 -8.6,-5.501 ; -9.1,-7.487 -4.9,-7.487 ; -9.1,-7.487 -9.1,-4.299 ; -9.1,-4.299 -9.063,-4.193 ; -8.815,5.6 -8.815,2.701 -5.585,2.701 -5.585,5.6 ; -8.815,5.6 -5.585,5.6 ; -8.6,-5.501 -6.15,-5.501 ; -6.15,-5.501 -4.9,-7.487 ; -4.9,-7.487 -4.9,-4.299 ; -4.9,-4.299 -4.1,-4.299 ; -4.9,-4.299 -4.994,-4.193 -4.063,-4.193 -4.1,-4.299 ; -4.1,-7.487 -3.6,-5.501 ; -4.1,-7.487 0.1,-7.487 ; -4.1,-7.487 -4.1,-4.299 ; -3.815,5.6 -3.815,2.701 -0.585,2.701 -0.585,5.6 ; -3.815,5.6 -0.585,5.6 ; -3.6,-5.501 -1.15,-5.501 ; -1.15,-5.501 0.1,-7.487 ; 0.1,-7.487 0.1,-4.299 ; 0.1,-4.299 0.9,-4.299 ; 0.9,-7.487 1.4,-5.501 ; 0.9,-7.487 5.1,-7.487 ; 0.9,-7.487 0.9,-4.299 ; 1.185,5.6 1.185,2.701 4.415,2.701 4.415,5.6 ; 1.185,5.6 4.415,5.6 ; 1.4,-5.501 3.85,-5.501 ; 3.85,-5.501 5.1,-7.487 ; 5.1,-7.487 5.1,-4.299 ; 5.1,-4.299 5.9,-4.299 ; 5.9,-7.487 6.4,-5.501 ; 5.9,-7.487 10.1,-7.487 ; 5.9,-7.487 5.9,-4.299 ; 6.185,5.6 6.185,2.701 9.415,2.701 9.415,5.6 ; 6.185,5.6 9.415,5.6 ; 6.4,-5.501 8.85,-5.501 ; 8.85,-5.501 10.1,-7.487 ; 10.1,-7.487 10.1,-4.299 ; -10.5,0 10.5,0 -10.5,0
Mechanical 8:
  lines w0.1: -8.6,-3.756 -7.6,-3.756 ; -8.6,1.244 -7.6,1.244 ; -7.6,-4.756 -7.6,-3.756 ; -7.6,-2.756 -7.6,-3.756 ; -7.6,0.244 -7.6,1.244 ; -7.6,2.244 -7.6,1.244 ; -6.6,-3.756 -7.6,-3.756 ; -6.6,1.244 -7.6,1.244 ; -3.6,-3.756 -2.6,-3.756 ; -3.6,1.244 -2.6,1.244 ; -2.6,-4.756 -2.6,-3.756 ; -2.6,-2.756 -2.6,-3.756 ; -2.6,0.244 -2.6,1.244 ; -2.6,2.244 -2.6,1.244 ; -1.6,-3.756 -2.6,-3.756 ; -1.6,1.244 -2.6,1.244 ; -1,0 1,0 ; 0,-1 0,1 ; 1.4,-3.756 2.4,-3.756 ; 1.4,1.244 2.4,1.244 ; 2.4,-4.756 2.4,-3.756 ; 2.4,-2.756 2.4,-3.756 ; 2.4,0.244 2.4,1.244 ; 2.4,2.244 2.4,1.244 ; 3.4,-3.756 2.4,-3.756 ; 3.4,1.244 2.4,1.244 ; 6.4,-3.756 7.4,-3.756 ; 6.4,1.244 7.4,1.244 ; 7.4,-4.756 7.4,-3.756 ; 7.4,-2.756 7.4,-3.756 ; 7.4,0.244 7.4,1.244 ; 7.4,2.244 7.4,1.244 ; 8.4,-3.756 7.4,-3.756 ; 8.4,1.244 7.4,1.244
Mechanical 14:
  lines w0.1: -10.5,-6.596 -11.1,-6.596 -11.1,-5.396 -10.5,-5.396 ; -10.5,-2.766 -11.1,-2.766 -11.1,-1.166 -10.5,-1.166 ; -10.5,-0.486 10.5,-0.486 ; -10.5,1.504 10.5,1.504 ; -10.5,2.325 -11.1,2.325 -11.1,3.925 -10.5,3.925 ; -10.5,4.649 -11.1,4.649 -11.1,5.844 -10.5,5.844 ; -9.5,-4.193 -9.063,-4.193 ; -8.8,-2.001 -5.2,-2.001 ; -8.8,-1.047 -5.2,-1.047 ; -8.6,-4.193 -8.6,-5.501 ; -7.815,2.701 -7.815,4.893 ccw(c-8.315,4.936) -8.108,5.393 ccw(c-9.052,3.479) -8.815,5.6 ; -7.815,4.54 -6.585,4.54 ; -6.585,2.701 -6.585,4.893 cw(c-6.085,4.936) -6.292,5.393 cw(c-5.348,3.479) -5.585,5.6 ; -6.15,-4.193 -6.15,-5.501 ; -3.8,-2.001 -0.2,-2.001 ; -3.8,-1.047 -0.2,-1.047 ; -3.6,-4.193 -3.6,-5.501 ; -2.815,2.701 -2.815,4.893 ccw(c-3.315,4.936) -3.108,5.393 ccw(c-4.052,3.479) -3.815,5.6 ; -2.815,4.54 -1.585,4.54 ; -1.585,2.701 -1.585,4.893 cw(c-1.085,4.936) -1.292,5.393 cw(c-0.348,3.479) -0.585,5.6 ; -1.15,-4.193 -1.15,-5.501 ; 0.006,-4.193 0.1,-4.299 ; 0.938,-4.193 0.9,-4.299 ; 1.2,-2.001 4.8,-2.001 ; 1.2,-1.047 4.8,-1.047 ; 1.4,-4.193 1.4,-5.501 ; 2.185,2.701 2.185,4.893 ccw(c1.685,4.936) 1.892,5.393 ccw(c0.948,3.479) 1.185,5.6 ; 2.185,4.54 3.415,4.54 ; 3.415,2.701 3.415,4.893 cw(c3.915,4.936) 3.708,5.393 cw(c4.652,3.479) 4.415,5.6 ; 3.85,-4.193 3.85,-5.501 ; 5.006,-4.193 5.1,-4.299 ; 5.938,-4.193 5.9,-4.299 ; 6.2,-2.001 9.8,-2.001 ; 6.2,-1.047 9.8,-1.047 ; 6.4,-4.193 6.4,-5.501 ; 7.185,2.701 7.185,4.893 ccw(c6.685,4.936) 6.892,5.393 ccw(c5.948,3.479) 6.185,5.6 ; 7.185,4.54 8.415,4.54 ; 8.415,2.701 8.415,4.893 cw(c8.915,4.936) 8.708,5.393 cw(c9.652,3.479) 9.415,5.6 ; 8.85,-4.193 8.85,-5.501 ; 10.006,-4.193 10.1,-4.299 ; 10.5,-7.842 -10.5,-7.842 -10.5,6.244 10.5,6.244 10.5,-7.828 ; 10.5,-4.299 10.1,-4.299 ; 10.5,-4.193 -9.063,-4.193 ; 10.5,-3.224 11.2,-3.224 11.2,0.156 10.5,0.156 ; 10.5,-2.107 9.8,-2.107 9.8,-0.552 6.2,-0.552 6.2,-2.107 4.8,-2.107 4.8,-0.552 1.2,-0.552 1.2,-2.107 -0.2,-2.107 -0.2,-0.552 -3.8,-0.552 -3.8,-2.107 -5.2,-2.107 -5.2,-0.552 -8.8,-0.552 -8.8,-2.107 -9.5,-2.107 -9.5,-4.299 -9.1,-4.299 ; -9.1,-7.487 -8.6,-5.501 ; -9.1,-7.487 -4.9,-7.487 ; -9.1,-7.487 -9.1,-4.299 ; -9.1,-4.299 -9.063,-4.193 ; -8.815,5.6 -8.815,2.701 -5.585,2.701 -5.585,5.6 ; -8.815,5.6 -5.585,5.6 ; -8.6,-5.501 -6.15,-5.501 ; -6.15,-5.501 -4.9,-7.487 ; -4.9,-7.487 -4.9,-4.299 ; -4.9,-4.299 -4.1,-4.299 ; -4.9,-4.299 -4.994,-4.193 -4.063,-4.193 -4.1,-4.299 ; -4.1,-7.487 -3.6,-5.501 ; -4.1,-7.487 0.1,-7.487 ; -4.1,-7.487 -4.1,-4.299 ; -3.815,5.6 -3.815,2.701 -0.585,2.701 -0.585,5.6 ; -3.815,5.6 -0.585,5.6 ; -3.6,-5.501 -1.15,-5.501 ; -1.15,-5.501 0.1,-7.487 ; 0.1,-7.487 0.1,-4.299 ; 0.1,-4.299 0.9,-4.299 ; 0.9,-7.487 1.4,-5.501 ; 0.9,-7.487 5.1,-7.487 ; 0.9,-7.487 0.9,-4.299 ; 1.185,5.6 1.185,2.701 4.415,2.701 4.415,5.6 ; 1.185,5.6 4.415,5.6 ; 1.4,-5.501 3.85,-5.501 ; 3.85,-5.501 5.1,-7.487 ; 5.1,-7.487 5.1,-4.299 ; 5.1,-4.299 5.9,-4.299 ; 5.9,-7.487 6.4,-5.501 ; 5.9,-7.487 10.1,-7.487 ; 5.9,-7.487 5.9,-4.299 ; 6.185,5.6 6.185,2.701 9.415,2.701 9.415,5.6 ; 6.185,5.6 9.415,5.6 ; 6.4,-5.501 8.85,-5.501 ; 8.85,-5.501 10.1,-7.487 ; 10.1,-7.487 10.1,-4.299 ; -10.5,0 10.5,0 -10.5,0
3D body: height 12.71, standoff -4, extent -11.1,-7.841 11.2,6.244